# Altium schematic symbol library 13-Logic 数字 IC.SchLib: 324 symbols (part 12 of 30) (continued)
## TMS320C6424ZDU (continued)

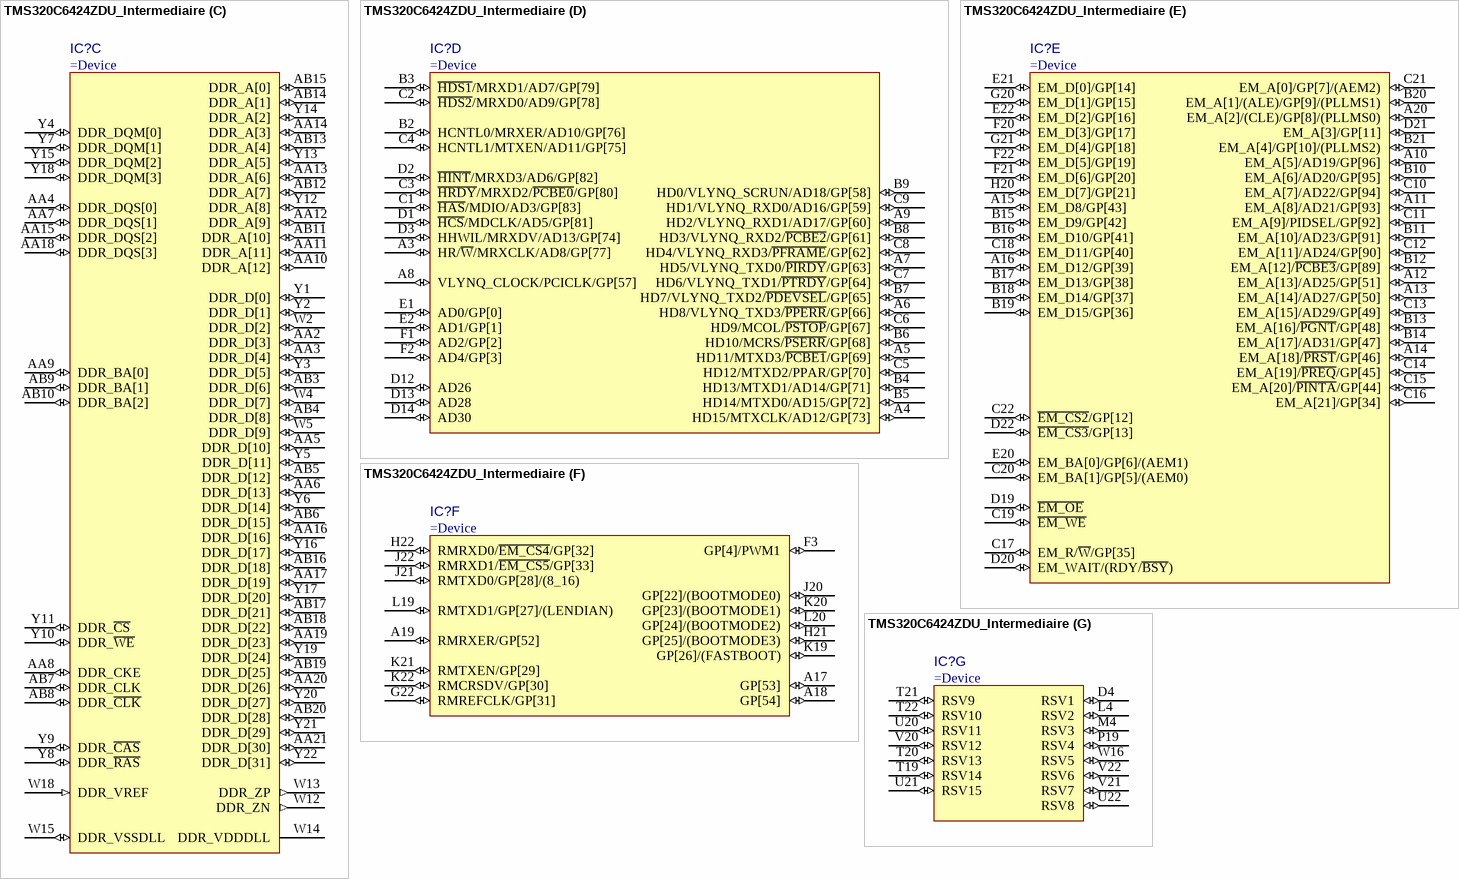
[diagram p75: symbol TMS320C6424ZDU_Intermediaire]

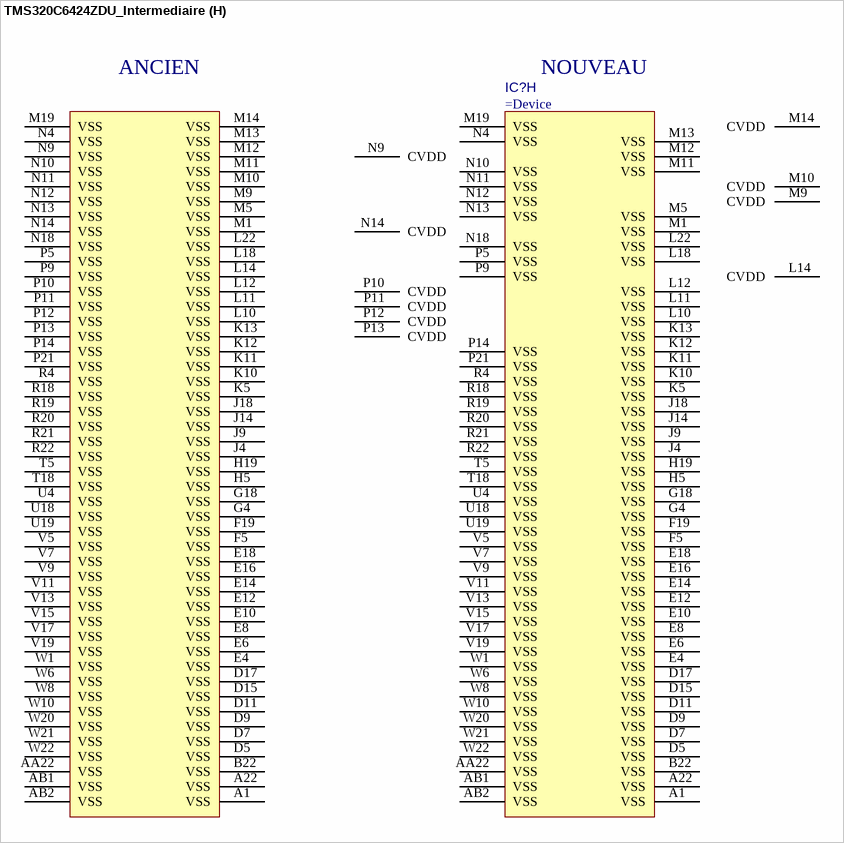
[diagram p76: symbol TMS320C6424ZDU_Intermediaire]

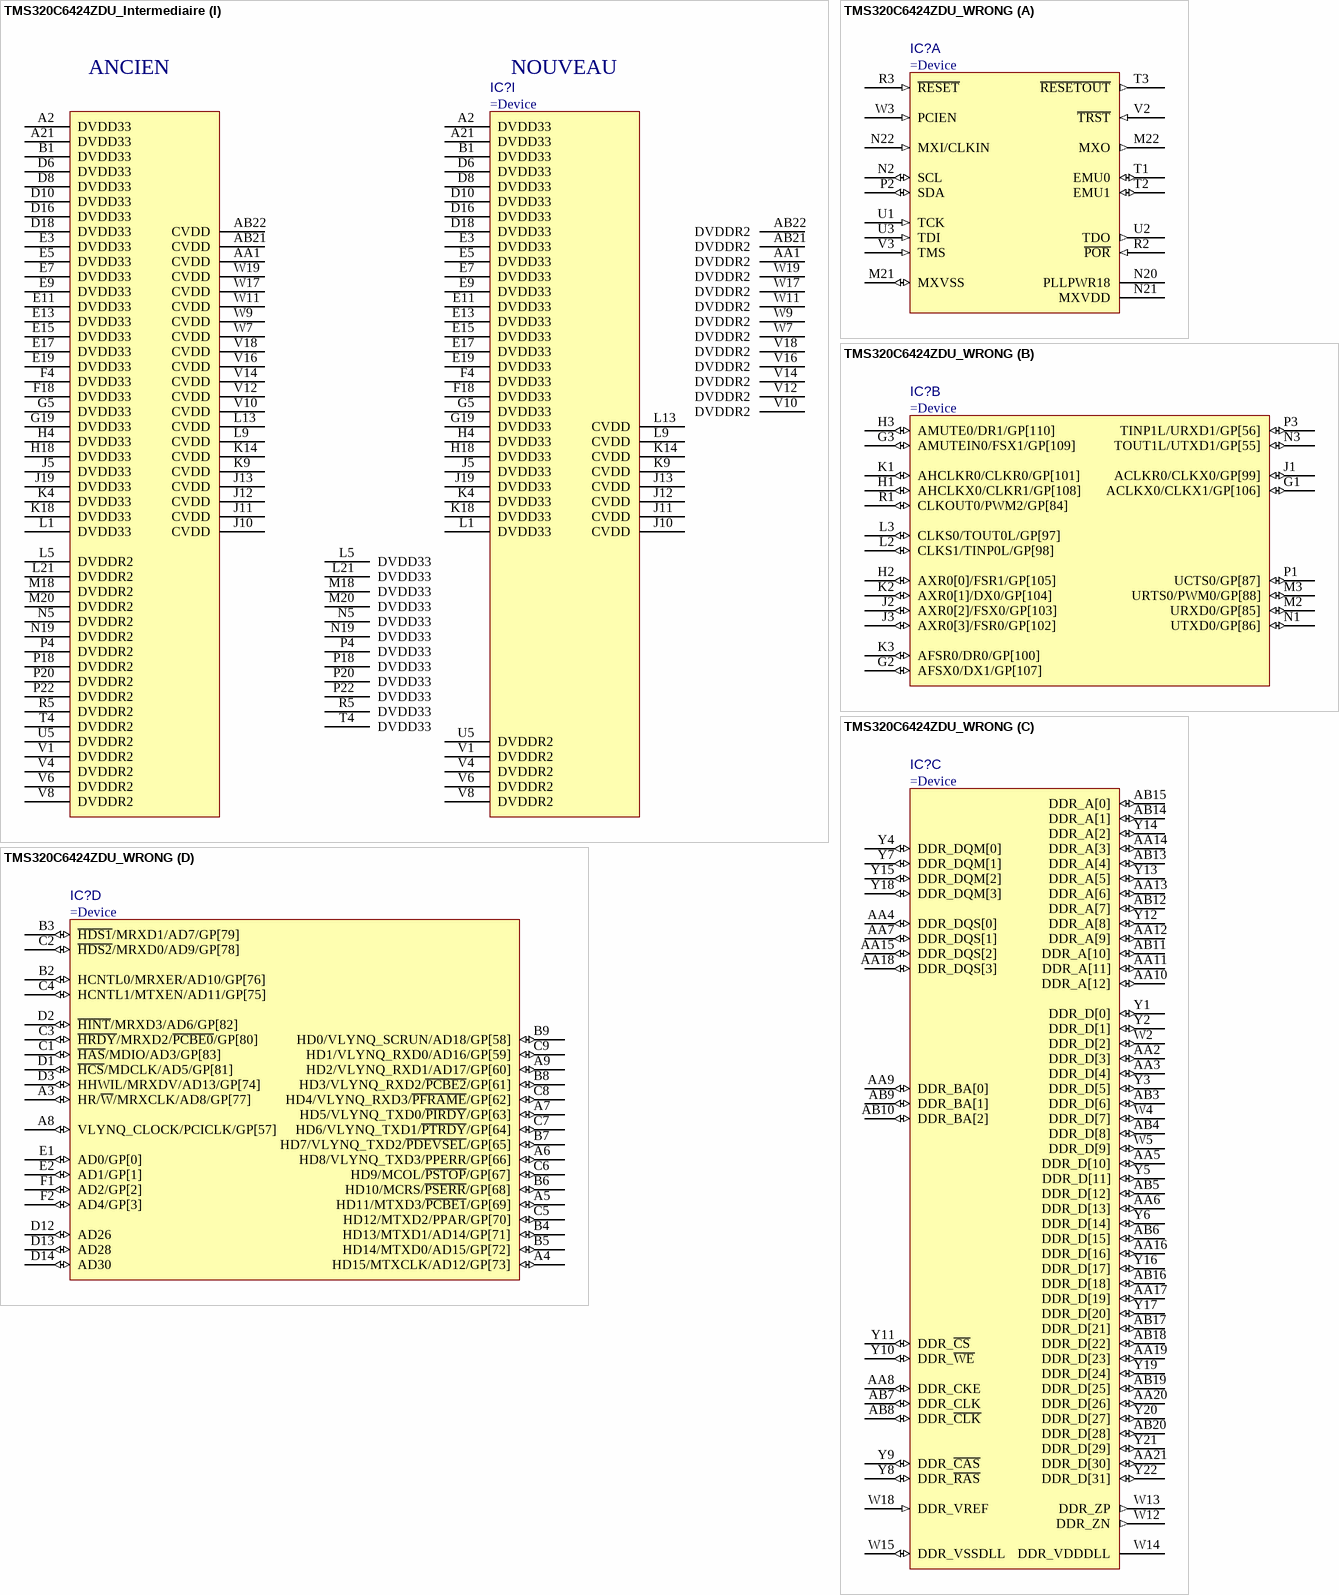
[diagram p77: symbols TMS320C6424ZDU_Intermediaire to TMS320C6424ZDU_WRONG]

## TMS320C6424ZDU_Intermediaire
designator IC?
Fixed-Point Digital Signal Processor (DSP)
part A pins: M21 MXVSS (io), M22 MXO (out), N2 SCL (io), N20 PLLPWR18 (power), N21 MXVDD (power), N22 MXI/CLKIN (in), P2 SDA (io), R2 ~{POR} (in), R3 ~{RESET} (in), T1 EMU0 (io), T2 EMU1 (io), T3 ~{RESETOUT} (out), U1 TCK (in), U2 TDO (out), U3 TDI (in), V2 ~{TRST} (in), V3 TMS (in), W3 PCIEN (in)
part B pins: G1 ACLKX0/CLKX1/GP[106] (io), G2 AFSX0/DX1/GP[107] (io), G3 AMUTEIN0/FSX1/GP[109] (io), H1 AHCLKX0/CLKR1/GP[108] (io), H2 AXR0[0]/FSR1/GP[105] (io), H3 AMUTE0/DR1/GP[110] (io), J1 ACLKR0/CLKX0/GP[99] (io), J2 AXR0[2]/FSX0/GP[103] (io), J3 AXR0[3]/FSR0/GP[102] (io), K1 AHCLKR0/CLKR0/GP[101] (io), K2 AXR0[1]/DX0/GP[104] (io), K3 AFSR0/DR0/GP[100] (io), L2 CLKS1/TINP0L/GP[98] (io), L3 CLKS0/TOUT0L/GP[97] (io), M2 URXD0/GP[85] (io), M3 URTS0/PWM0/GP[88] (io), N1 UTXD0/GP[86] (io), N3 TOUT1L/UTXD1/GP[55] (io), P1 UCTS0/GP[87] (io), P3 TINP1L/URXD1/GP[56] (io), R1 CLKOUT0/PWM2/GP[84] (io)
part C pins: AA2 DDR_D[3] (io), AA3 DDR_D[4] (io), AA4 DDR_DQS[0] (io), AA5 DDR_D[10] (io), AA6 DDR_D[13] (io), AA7 DDR_DQS[1] (io), AA8 DDR_CKE (io), AA9 DDR_BA[0] (io), AA10 DDR_A[12] (io), AA11 DDR_A[11] (io), AA12 DDR_A[9] (io), AA13 DDR_A[6] (io), AA14 DDR_A[3] (io), AA15 DDR_DQS[2] (io), AA16 DDR_D[16] (io), AA17 DDR_D[19] (io), AA18 DDR_DQS[3] (io), AA19 DDR_D[23] (io), AA20 DDR_D[26] (io), AA21 DDR_D[30] (io), AB3 DDR_D[6] (io), AB4 DDR_D[8] (io), AB5 DDR_D[12] (io), AB6 DDR_D[15] (io), AB7 DDR_CLK (io), AB8 DDR_~{CLK} (io), AB9 DDR_BA[1] (io), AB10 DDR_BA[2] (io), AB11 DDR_A[10] (io), AB12 DDR_A[7] (io), AB13 DDR_A[4] (io), AB14 DDR_A[1] (io), AB15 DDR_A[0] (io), AB16 DDR_D[18] (io), AB17 DDR_D[21] (io), AB18 DDR_D[22] (io), AB19 DDR_D[25] (io), AB20 DDR_D[28] (io), W2 DDR_D[2] (io), W4 DDR_D[7] (io), W5 DDR_D[9] (io), W12 DDR_ZN (out), W13 DDR_ZP (out), W14 DDR_VDDDLL (power), W15 DDR_VSSDLL (io), W18 DDR_VREF (in), Y1 DDR_D[0] (io), Y2 DDR_D[1] (io), Y3 DDR_D[5] (io), Y4 DDR_DQM[0] (io), Y5 DDR_D[11] (io), Y6 DDR_D[14] (io), Y7 DDR_DQM[1] (io), Y8 DDR_~{RAS} (io), Y9 DDR_~{CAS} (io), Y10 DDR_~{WE} (io), Y11 DDR_~{CS} (io), Y12 DDR_A[8] (io), Y13 DDR_A[5] (io), Y14 DDR_A[2] (io), Y15 DDR_DQM[2] (io), Y16 DDR_D[17] (io), Y17 DDR_D[20] (io), Y18 DDR_DQM[3] (io), Y19 DDR_D[24] (io), Y20 DDR_D[27] (io), Y21 DDR_D[29] (io), Y22 DDR_D[31] (io)
part D pins: A3 HR/~{W}/MRXCLK/AD8/GP[77] (io), A4 HD15/MTXCLK/AD12/GP[73] (io), A5 HD11/MTXD3/~{PCBE1}/GP[69] (io), A6 HD8/VLYNQ_TXD3/~{PPERR}/GP[66] (io), A7 HD5/VLYNQ_TXD0/~{PIRDY}/GP[63] (io), A8 VLYNQ_CLOCK/PCICLK/GP[57] (io), A9 HD2/VLYNQ_RXD1/AD17/GP[60] (io), B2 HCNTL0/MRXER/AD10/GP[76] (io), B3 ~{HDS1}/MRXD1/AD7/GP[79] (io), B4 HD13/MTXD1/AD14/GP[71] (io), B5 HD14/MTXD0/AD15/GP[72] (io), B6 HD10/MCRS/~{PSERR}/GP[68] (io), B7 HD7/VLYNQ_TXD2/~{PDEVSEL}/GP[65] (io), B8 HD3/VLYNQ_RXD2/~{PCBE2}/GP[61] (io), B9 HD0/VLYNQ_SCRUN/AD18/GP[58] (io), C1 ~{HAS}/MDIO/AD3/GP[83] (io), C2 ~{HDS2}/MRXD0/AD9/GP[78] (io), C3 ~{HRDY}/MRXD2/~{PCBE0}/GP[80] (io), C4 HCNTL1/MTXEN/AD11/GP[75] (io), C5 HD12/MTXD2/PPAR/GP[70] (io), C6 HD9/MCOL/~{PSTOP}/GP[67] (io), C7 HD6/VLYNQ_TXD1/~{PTRDY}/GP[64] (io), C8 HD4/VLYNQ_RXD3/~{PFRAME}/GP[62] (io), C9 HD1/VLYNQ_RXD0/AD16/GP[59] (io), D1 ~{HCS}/MDCLK/AD5/GP[81] (io), D2 ~{HINT}/MRXD3/AD6/GP[82] (io), D3 HHWIL/MRXDV/AD13/GP[74] (io), D12 AD26 (io), D13 AD28 (io), D14 AD30 (io), E1 AD0/GP[0] (io), E2 AD1/GP[1] (io), F1 AD2/GP[2] (io), F2 AD4/GP[3] (io)
part E pins: A10 EM_A[5]/AD19/GP[96] (io), A11 EM_A[8]/AD21/GP[93] (io), A12 EM_A[13]/AD25/GP[51] (io), A13 EM_A[14]/AD27/GP[50] (io), A14 EM_A[18]/~{PRST}/GP[46] (io), A15 EM_D8/GP[43] (io), A16 EM_D12/GP[39] (io), A20 EM_A[2]/(CLE)/GP[8]/(PLLMS0) (io), B10 EM_A[6]/AD20/GP[95] (io), B11 EM_A[10]/AD23/GP[91] (io), B12 EM_A[12]/~{PCBE3}/GP[89] (io), B13 EM_A[16]/~{PGNT}/GP[48] (io), B14 EM_A[17]/AD31/GP[47] (io), B15 EM_D9/GP[42] (io), B16 EM_D10/GP[41] (io), B17 EM_D13/GP[38] (io), B18 EM_D14/GP[37] (io), B19 EM_D15/GP[36] (io), B20 EM_A[1]/(ALE)/GP[9]/(PLLMS1) (io), B21 EM_A[4]/GP[10]/(PLLMS2) (io), C10 EM_A[7]/AD22/GP[94] (io), C11 EM_A[9]/PIDSEL/GP[92] (io), C12 EM_A[11]/AD24/GP[90] (io), C13 EM_A[15]/AD29/GP[49] (io), C14 EM_A[19]/~{PREQ}/GP[45] (io), C15 EM_A[20]/~{PINTA}/GP[44] (io), C16 EM_A[21]/GP[34] (io), C17 EM_R/~{W}/GP[35] (io), C18 EM_D11/GP[40] (io), C19 ~{EM_WE} (io), C20 EM_BA[1]/GP[5]/(AEM0) (io), C21 EM_A[0]/GP[7]/(AEM2) (io), C22 ~{EM_CS2}/GP[12] (io), D19 ~{EM_OE} (io), D20 EM_WAIT/(RDY/~{BSY}) (io), D21 EM_A[3]/GP[11] (io), D22 ~{EM_CS3}/GP[13] (io), E20 EM_BA[0]/GP[6]/(AEM1) (io), E21 EM_D[0]/GP[14] (io), E22 EM_D[2]/GP[16] (io), F20 EM_D[3]/GP[17] (io), F21 EM_D[6]/GP[20] (io), F22 EM_D[5]/GP[19] (io), G20 EM_D[1]/GP[15] (io), G21 EM_D[4]/GP[18] (io), H20 EM_D[7]/GP[21] (io)
part F pins: A17 GP[53] (io), A18 GP[54] (io), A19 RMRXER/GP[52] (io), F3 GP[4]/PWM1 (io), G22 RMREFCLK/GP[31] (io), H21 GP[25]/(BOOTMODE3) (io), H22 RMRXD0/~{EM_CS4}/GP[32] (io), J20 GP[22]/(BOOTMODE0) (io), J21 RMTXD0/GP[28]/(8_16) (io), J22 RMRXD1/~{EM_CS5}/GP[33] (io), K19 GP[26]/(FASTBOOT) (io), K20 GP[23]/(BOOTMODE1) (io), K21 RMTXEN/GP[29] (io), K22 RMCRSDV/GP[30] (io), L19 RMTXD1/GP[27]/(LENDIAN) (io), L20 GP[24]/(BOOTMODE2) (io)
part G pins: D4 RSV1 (io), L4 RSV2 (io), M4 RSV3 (io), P19 RSV4 (io), T19 RSV14 (io), T20 RSV13 (io), T21 RSV9 (io), T22 RSV10 (io), U20 RSV11 (io), U21 RSV15 (io), U22 RSV8 (io), V20 RSV12 (io), V21 RSV7 (io), V22 RSV6 (io), W16 RSV5 (io)
part H pins: A1 VSS (power), A1 VSS (power), A22 VSS (power), A22 VSS (power), AA22 VSS (power), AA22 VSS (power), AB1 VSS (power), AB1 VSS (power), AB2 VSS (power), AB2 VSS (power), B22 VSS (power), B22 VSS (power), D5 VSS (power), D5 VSS (power), D7 VSS (power), D7 VSS (power), D9 VSS (power), D9 VSS (power), D11 VSS (power), D11 VSS (power), D15 VSS (power), D15 VSS (power), D17 VSS (power), D17 VSS (power), E4 VSS (power), E4 VSS (power), E6 VSS (power), E6 VSS (power), E8 VSS (power), E8 VSS (power), E10 VSS (power), E10 VSS (power), E12 VSS (power), E12 VSS (power), E14 VSS (power), E14 VSS (power), E16 VSS (power), E16 VSS (power), E18 VSS (power), E18 VSS (power), F5 VSS (power), F5 VSS (power), F19 VSS (power), F19 VSS (power), G4 VSS (power), G4 VSS (power), G18 VSS (power), G18 VSS (power), H5 VSS (power), H5 VSS (power), H19 VSS (power), H19 VSS (power), J4 VSS (power), J4 VSS (power), J9 VSS (power), J9 VSS (power), J14 VSS (power), J14 VSS (power), J18 VSS (power), J18 VSS (power), K5 VSS (power), K5 VSS (power), K10 VSS (power), K10 VSS (power), K11 VSS (power), K11 VSS (power), K12 VSS (power), K12 VSS (power), K13 VSS (power), K13 VSS (power), L10 VSS (power), L10 VSS (power), L11 VSS (power), L11 VSS (power), L12 VSS (power), L12 VSS (power), L14 CVDD (power), L14 VSS (power), L18 VSS (power), L18 VSS (power), L22 VSS (power), L22 VSS (power), M1 VSS (power), M1 VSS (power), M5 VSS (power), M5 VSS (power), M9 CVDD (power), M9 VSS (power), M10 CVDD (power), M10 VSS (power), M11 VSS (power), M11 VSS (power), M12 VSS (power), M12 VSS (power), M13 VSS (power), M13 VSS (power), M14 CVDD (power), M14 VSS (power), M19 VSS (power), M19 VSS (power), N4 VSS (power), N4 VSS (power), N9 CVDD (power), N9 VSS (power), N10 VSS (power), N10 VSS (power), N11 VSS (power), N11 VSS (power), N12 VSS (power), N12 VSS (power), N13 VSS (power), N13 VSS (power), N14 CVDD (power), N14 VSS (power), N18 VSS (power), N18 VSS (power), P5 VSS (power), P5 VSS (power), P9 VSS (power), P9 VSS (power), P10 CVDD (power), P10 VSS (power), P11 CVDD (power), P11 VSS (power), P12 CVDD (power), P12 VSS (power), P13 CVDD (power), P13 VSS (power), P14 VSS (power), P14 VSS (power), P21 VSS (power), P21 VSS (power), R4 VSS (power), R4 VSS (power), R18 VSS (power), R18 VSS (power), R19 VSS (power), R19 VSS (power), R20 VSS (power), R20 VSS (power), R21 VSS (power), R21 VSS (power), R22 VSS (power), R22 VSS (power), T5 VSS (power), T5 VSS (power), T18 VSS (power), T18 VSS (power), U4 VSS (power), U4 VSS (power), U18 VSS (power), U18 VSS (power), U19 VSS (power), U19 VSS (power), V5 VSS (power), V5 VSS (power), V7 VSS (power), V7 VSS (power), V9 VSS (power), V9 VSS (power), V11 VSS (power), V11 VSS (power), V13 VSS (power), V13 VSS (power), V15 VSS (power), V15 VSS (power), V17 VSS (power), V17 VSS (power), V19 VSS (power), V19 VSS (power), W1 VSS (power), W1 VSS (power), W6 VSS (power), W6 VSS (power), W8 VSS (power), W8 VSS (power), W10 VSS (power), W10 VSS (power), W20 VSS (power), W20 VSS (power), W21 VSS (power), W21 VSS (power), W22 VSS (power), W22 VSS (power)
part I pins: A2 DVDD33 (power), A2 DVDD33 (power), A21 DVDD33 (power), A21 DVDD33 (power), AA1 DVDDR2 (power), AA1 CVDD (power), AB21 DVDDR2 (power), AB21 CVDD (power), AB22 DVDDR2 (power), AB22 CVDD (power), B1 DVDD33 (power), B1 DVDD33 (power), D6 DVDD33 (power), D6 DVDD33 (power), D8 DVDD33 (power), D8 DVDD33 (power), D10 DVDD33 (power), D10 DVDD33 (power), D16 DVDD33 (power), D16 DVDD33 (power), D18 DVDD33 (power), D18 DVDD33 (power), E3 DVDD33 (power), E3 DVDD33 (power), E5 DVDD33 (power), E5 DVDD33 (power), E7 DVDD33 (power), E7 DVDD33 (power), E9 DVDD33 (power), E9 DVDD33 (power), E11 DVDD33 (power), E11 DVDD33 (power), E13 DVDD33 (power), E13 DVDD33 (power), E15 DVDD33 (power), E15 DVDD33 (power), E17 DVDD33 (power), E17 DVDD33 (power), E19 DVDD33 (power), E19 DVDD33 (power), F4 DVDD33 (power), F4 DVDD33 (power), F18 DVDD33 (power), F18 DVDD33 (power), G5 DVDD33 (power), G5 DVDD33 (power), G19 DVDD33 (power), G19 DVDD33 (power), H4 DVDD33 (power), H4 DVDD33 (power), H18 DVDD33 (power), H18 DVDD33 (power), J5 DVDD33 (power), J5 DVDD33 (power), J10 CVDD (power), J10 CVDD (power), J11 CVDD (power), J11 CVDD (power), J12 CVDD (power), J12 CVDD (power), J13 CVDD (power), J13 CVDD (power), J19 DVDD33 (power), J19 DVDD33 (power), K4 DVDD33 (power), K4 DVDD33 (power), K9 CVDD (power), K9 CVDD (power), K14 CVDD (power), K14 CVDD (power), K18 DVDD33 (power), K18 DVDD33 (power), L1 DVDD33 (power), L1 DVDD33 (power), L5 DVDD33 (power), L5 DVDDR2 (power), L9 CVDD (power), L9 CVDD (power), L13 CVDD (power), L13 CVDD (power), L21 DVDD33 (power), L21 DVDDR2 (power), M18 DVDD33 (power), M18 DVDDR2 (power), M20 DVDD33 (power), M20 DVDDR2 (power), N5 DVDD33 (power), N5 DVDDR2 (power), N19 DVDD33 (power), N19 DVDDR2 (power), P4 DVDD33 (power), P4 DVDDR2 (power), P18 DVDD33 (power), P18 DVDDR2 (power), P20 DVDD33 (power), P20 DVDDR2 (power), P22 DVDD33 (power), P22 DVDDR2 (power), R5 DVDD33 (power), R5 DVDDR2 (power), T4 DVDD33 (power), T4 DVDDR2 (power), U5 DVDDR2 (power), U5 DVDDR2 (power), V1 DVDDR2 (power), V1 DVDDR2 (power), V4 DVDDR2 (power), V4 DVDDR2 (power), V6 DVDDR2 (power), V6 DVDDR2 (power), V8 DVDDR2 (power), V8 DVDDR2 (power), V10 DVDDR2 (power), V10 CVDD (power), V12 DVDDR2 (power), V12 CVDD (power), V14 DVDDR2 (power), V14 CVDD (power), V16 DVDDR2 (power), V16 CVDD (power), V18 DVDDR2 (power), V18 CVDD (power), W7 DVDDR2 (power), W7 CVDD (power), W9 DVDDR2 (power), W9 CVDD (power), W11 DVDDR2 (power), W11 CVDD (power), W17 DVDDR2 (power), W17 CVDD (power), W19 DVDDR2 (power), W19 CVDD (power)
part H text: ANCIEN; NOUVEAU
part I text: ANCIEN; NOUVEAU

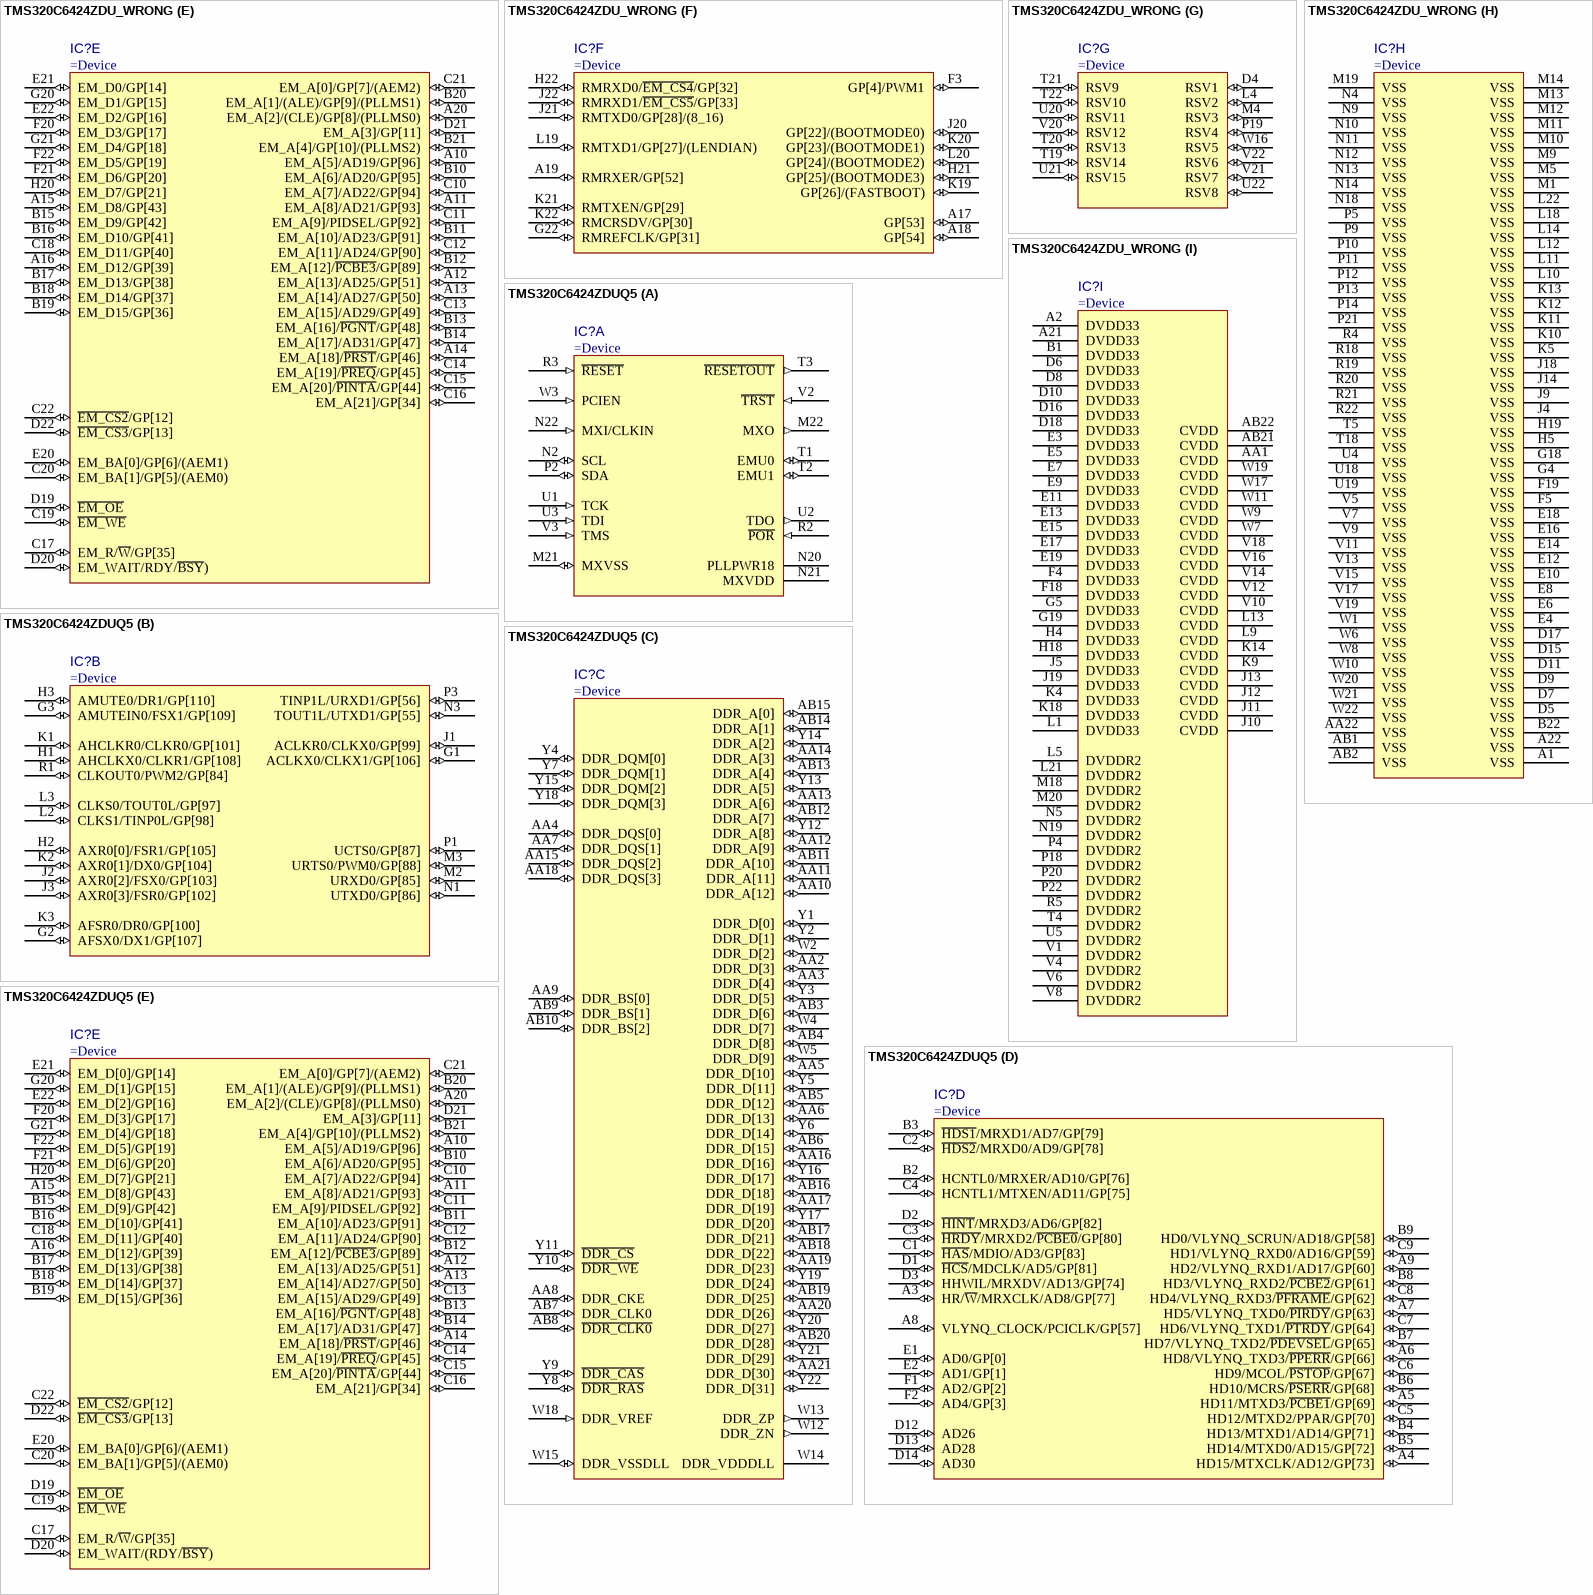
[diagram p78: symbols TMS320C6424ZDU_WRONG to TMS320C6424ZDUQ5]

## TMS320C6424ZDU_WRONG
designator IC?
Fixed-Point Digital Signal Processor (DSP)
part A pins: M21 MXVSS (io), M22 MXO (out), N2 SCL (io), N20 PLLPWR18 (power), N21 MXVDD (power), N22 MXI/CLKIN (in), P2 SDA (io), R2 ~{POR} (in), R3 ~{RESET} (in), T1 EMU0 (io), T2 EMU1 (io), T3 ~{RESETOUT} (out), U1 TCK (in), U2 TDO (out), U3 TDI (in), V2 ~{TRST} (in), V3 TMS (in), W3 PCIEN (in)
part B pins: G1 ACLKX0/CLKX1/GP[106] (io), G2 AFSX0/DX1/GP[107] (io), G3 AMUTEIN0/FSX1/GP[109] (io), H1 AHCLKX0/CLKR1/GP[108] (io), H2 AXR0[0]/FSR1/GP[105] (io), H3 AMUTE0/DR1/GP[110] (io), J1 ACLKR0/CLKX0/GP[99] (io), J2 AXR0[2]/FSX0/GP[103] (io), J3 AXR0[3]/FSR0/GP[102] (io), K1 AHCLKR0/CLKR0/GP[101] (io), K2 AXR0[1]/DX0/GP[104] (io), K3 AFSR0/DR0/GP[100] (io), L2 CLKS1/TINP0L/GP[98] (io), L3 CLKS0/TOUT0L/GP[97] (io), M2 URXD0/GP[85] (io), M3 URTS0/PWM0/GP[88] (io), N1 UTXD0/GP[86] (io), N3 TOUT1L/UTXD1/GP[55] (io), P1 UCTS0/GP[87] (io), P3 TINP1L/URXD1/GP[56] (io), R1 CLKOUT0/PWM2/GP[84] (io)
part C pins: AA2 DDR_D[3] (io), AA3 DDR_D[4] (io), AA4 DDR_DQS[0] (io), AA5 DDR_D[10] (io), AA6 DDR_D[13] (io), AA7 DDR_DQS[1] (io), AA8 DDR_CKE (io), AA9 DDR_BA[0] (io), AA10 DDR_A[12] (io), AA11 DDR_A[11] (io), AA12 DDR_A[9] (io), AA13 DDR_A[6] (io), AA14 DDR_A[3] (io), AA15 DDR_DQS[2] (io), AA16 DDR_D[16] (io), AA17 DDR_D[19] (io), AA18 DDR_DQS[3] (io), AA19 DDR_D[23] (io), AA20 DDR_D[26] (io), AA21 DDR_D[30] (io), AB3 DDR_D[6] (io), AB4 DDR_D[8] (io), AB5 DDR_D[12] (io), AB6 DDR_D[15] (io), AB7 DDR_CLK (io), AB8 DDR_~{CLK} (io), AB9 DDR_BA[1] (io), AB10 DDR_BA[2] (io), AB11 DDR_A[10] (io), AB12 DDR_A[7] (io), AB13 DDR_A[4] (io), AB14 DDR_A[1] (io), AB15 DDR_A[0] (io), AB16 DDR_D[18] (io), AB17 DDR_D[21] (io), AB18 DDR_D[22] (io), AB19 DDR_D[25] (io), AB20 DDR_D[28] (io), W2 DDR_D[2] (io), W4 DDR_D[7] (io), W5 DDR_D[9] (io), W12 DDR_ZN (out), W13 DDR_ZP (out), W14 DDR_VDDDLL (power), W15 DDR_VSSDLL (io), W18 DDR_VREF (in), Y1 DDR_D[0] (io), Y2 DDR_D[1] (io), Y3 DDR_D[5] (io), Y4 DDR_DQM[0] (io), Y5 DDR_D[11] (io), Y6 DDR_D[14] (io), Y7 DDR_DQM[1] (io), Y8 DDR_~{RAS} (io), Y9 DDR_~{CAS} (io), Y10 DDR_~{WE} (io), Y11 DDR_~{CS} (io), Y12 DDR_A[8] (io), Y13 DDR_A[5] (io), Y14 DDR_A[2] (io), Y15 DDR_DQM[2] (io), Y16 DDR_D[17] (io), Y17 DDR_D[20] (io), Y18 DDR_DQM[3] (io), Y19 DDR_D[24] (io), Y20 DDR_D[27] (io), Y21 DDR_D[29] (io), Y22 DDR_D[31] (io)
part D pins: A3 HR/~{W}/MRXCLK/AD8/GP[77] (io), A4 HD15/MTXCLK/AD12/GP[73] (io), A5 HD11/MTXD3/~{PCBE1}/GP[69] (io), A6 HD8/VLYNQ_TXD3/PPERR/GP[66] (io), A7 HD5/VLYNQ_TXD0/~{PIRDY}/GP[63] (io), A8 VLYNQ_CLOCK/PCICLK/GP[57] (io), A9 HD2/VLYNQ_RXD1/AD17/GP[60] (io), B2 HCNTL0/MRXER/AD10/GP[76] (io), B3 ~{HDS1}/MRXD1/AD7/GP[79] (io), B4 HD13/MTXD1/AD14/GP[71] (io), B5 HD14/MTXD0/AD15/GP[72] (io), B6 HD10/MCRS/~{PSERR}/GP[68] (io), B7 HD7/VLYNQ_TXD2/~{PDEVSEL}/GP[65] (io), B8 HD3/VLYNQ_RXD2/~{PCBE2}/GP[61] (io), B9 HD0/VLYNQ_SCRUN/AD18/GP[58] (io), C1 ~{HAS}/MDIO/AD3/GP[83] (io), C2 ~{HDS2}/MRXD0/AD9/GP[78] (io), C3 ~{HRDY}/MRXD2/~{PCBE0}/GP[80] (io), C4 HCNTL1/MTXEN/AD11/GP[75] (io), C5 HD12/MTXD2/PPAR/GP[70] (io), C6 HD9/MCOL/~{PSTOP}/GP[67] (io), C7 HD6/VLYNQ_TXD1/~{PTRDY}/GP[64] (io), C8 HD4/VLYNQ_RXD3/~{PFRAME}/GP[62] (io), C9 HD1/VLYNQ_RXD0/AD16/GP[59] (io), D1 ~{HCS}/MDCLK/AD5/GP[81] (io), D2 ~{HINT}/MRXD3/AD6/GP[82] (io), D3 HHWIL/MRXDV/AD13/GP[74] (io), D12 AD26 (io), D13 AD28 (io), D14 AD30 (io), E1 AD0/GP[0] (io), E2 AD1/GP[1] (io), F1 AD2/GP[2] (io), F2 AD4/GP[3] (io)
part E pins: A10 EM_A[5]/AD19/GP[96] (io), A11 EM_A[8]/AD21/GP[93] (io), A12 EM_A[13]/AD25/GP[51] (io), A13 EM_A[14]/AD27/GP[50] (io), A14 EM_A[18]/~{PRST}/GP[46] (io), A15 EM_D8/GP[43] (io), A16 EM_D12/GP[39] (io), A20 EM_A[2]/(CLE)/GP[8]/(PLLMS0) (io), B10 EM_A[6]/AD20/GP[95] (io), B11 EM_A[10]/AD23/GP[91] (io), B12 EM_A[12]/~{PCBE3}/GP[89] (io), B13 EM_A[16]/~{PGNT}/GP[48] (io), B14 EM_A[17]/AD31/GP[47] (io), B15 EM_D9/GP[42] (io), B16 EM_D10/GP[41] (io), B17 EM_D13/GP[38] (io), B18 EM_D14/GP[37] (io), B19 EM_D15/GP[36] (io), B20 EM_A[1]/(ALE)/GP[9]/(PLLMS1) (io), B21 EM_A[4]/GP[10]/(PLLMS2) (io), C10 EM_A[7]/AD22/GP[94] (io), C11 EM_A[9]/PIDSEL/GP[92] (io), C12 EM_A[11]/AD24/GP[90] (io), C13 EM_A[15]/AD29/GP[49] (io), C14 EM_A[19]/~{PREQ}/GP[45] (io), C15 EM_A[20]/~{PINTA}/GP[44] (io), C16 EM_A[21]/GP[34] (io), C17 EM_R/~{W}/GP[35] (io), C18 EM_D11/GP[40] (io), C19 ~{EM_WE} (io), C20 EM_BA[1]/GP[5]/(AEM0) (io), C21 EM_A[0]/GP[7]/(AEM2) (io), C22 ~{EM_CS2}/GP[12] (io), D19 ~{EM_OE} (io), D20 EM_WAIT/RDY/~{BSY}) (io), D21 EM_A[3]/GP[11] (io), D22 ~{EM_CS3}/GP[13] (io), E20 EM_BA[0]/GP[6]/(AEM1) (io), E21 EM_D0/GP[14] (io), E22 EM_D2/GP[16] (io), F20 EM_D3/GP[17] (io), F21 EM_D6/GP[20] (io), F22 EM_D5/GP[19] (io), G20 EM_D1/GP[15] (io), G21 EM_D4/GP[18] (io), H20 EM_D7/GP[21] (io)
part F pins: A17 GP[53] (io), A18 GP[54] (io), A19 RMRXER/GP[52] (io), F3 GP[4]/PWM1 (io), G22 RMREFCLK/GP[31] (io), H21 GP[25]/(BOOTMODE3) (io), H22 RMRXD0/~{EM_CS4}/GP[32] (io), J20 GP[22]/(BOOTMODE0) (io), J21 RMTXD0/GP[28]/(8_16) (io), J22 RMRXD1/~{EM_CS5}/GP[33] (io), K19 GP[26]/(FASTBOOT) (io), K20 GP[23]/(BOOTMODE1) (io), K21 RMTXEN/GP[29] (io), K22 RMCRSDV/GP[30] (io), L19 RMTXD1/GP[27]/(LENDIAN) (io), L20 GP[24]/(BOOTMODE2) (io)
part G pins: D4 RSV1 (io), L4 RSV2 (io), M4 RSV3 (io), P19 RSV4 (io), T19 RSV14 (io), T20 RSV13 (io), T21 RSV9 (io), T22 RSV10 (io), U20 RSV11 (io), U21 RSV15 (io), U22 RSV8 (io), V20 RSV12 (io), V21 RSV7 (io), V22 RSV6 (io), W16 RSV5 (io)
part H pins: A1 VSS (power), A22 VSS (power), AA22 VSS (power), AB1 VSS (power), AB2 VSS (power), B22 VSS (power), D5 VSS (power), D7 VSS (power), D9 VSS (power), D11 VSS (power), D15 VSS (power), D17 VSS (power), E4 VSS (power), E6 VSS (power), E8 VSS (power), E10 VSS (power), E12 VSS (power), E14 VSS (power), E16 VSS (power), E18 VSS (power), F5 VSS (power), F19 VSS (power), G4 VSS (power), G18 VSS (power), H5 VSS (power), H19 VSS (power), J4 VSS (power), J9 VSS (power), J14 VSS (power), J18 VSS (power), K5 VSS (power), K10 VSS (power), K11 VSS (power), K12 VSS (power), K13 VSS (power), L10 VSS (power), L11 VSS (power), L12 VSS (power), L14 VSS (power), L18 VSS (power), L22 VSS (power), M1 VSS (power), M5 VSS (power), M9 VSS (power), M10 VSS (power), M11 VSS (power), M12 VSS (power), M13 VSS (power), M14 VSS (power), M19 VSS (power), N4 VSS (power), N9 VSS (power), N10 VSS (power), N11 VSS (power), N12 VSS (power), N13 VSS (power), N14 VSS (power), N18 VSS (power), P5 VSS (power), P9 VSS (power), P10 VSS (power), P11 VSS (power), P12 VSS (power), P13 VSS (power), P14 VSS (power), P21 VSS (power), R4 VSS (power), R18 VSS (power), R19 VSS (power), R20 VSS (power), R21 VSS (power), R22 VSS (power), T5 VSS (power), T18 VSS (power), U4 VSS (power), U18 VSS (power), U19 VSS (power), V5 VSS (power), V7 VSS (power), V9 VSS (power), V11 VSS (power), V13 VSS (power), V15 VSS (power), V17 VSS (power), V19 VSS (power), W1 VSS (power), W6 VSS (power), W8 VSS (power), W10 VSS (power), W20 VSS (power), W21 VSS (power), W22 VSS (power)
part I pins: A2 DVDD33 (power), A21 DVDD33 (power), AA1 CVDD (power), AB21 CVDD (power), AB22 CVDD (power), B1 DVDD33 (power), D6 DVDD33 (power), D8 DVDD33 (power), D10 DVDD33 (power), D16 DVDD33 (power), D18 DVDD33 (power), E3 DVDD33 (power), E5 DVDD33 (power), E7 DVDD33 (power), E9 DVDD33 (power), E11 DVDD33 (power), E13 DVDD33 (power), E15 DVDD33 (power), E17 DVDD33 (power), E19 DVDD33 (power), F4 DVDD33 (power), F18 DVDD33 (power), G5 DVDD33 (power), G19 DVDD33 (power), H4 DVDD33 (power), H18 DVDD33 (power), J5 DVDD33 (power), J10 CVDD (power), J11 CVDD (power), J12 CVDD (power), J13 CVDD (power), J19 DVDD33 (power), K4 DVDD33 (power), K9 CVDD (power), K14 CVDD (power), K18 DVDD33 (power), L1 DVDD33 (power), L5 DVDDR2 (power), L9 CVDD (power), L13 CVDD (power), L21 DVDDR2 (power), M18 DVDDR2 (power), M20 DVDDR2 (power), N5 DVDDR2 (power), N19 DVDDR2 (power), P4 DVDDR2 (power), P18 DVDDR2 (power), P20 DVDDR2 (power), P22 DVDDR2 (power), R5 DVDDR2 (power), T4 DVDDR2 (power), U5 DVDDR2 (power), V1 DVDDR2 (power), V4 DVDDR2 (power), V6 DVDDR2 (power), V8 DVDDR2 (power), V10 CVDD (power), V12 CVDD (power), V14 CVDD (power), V16 CVDD (power), V18 CVDD (power), W7 CVDD (power), W9 CVDD (power), W11 CVDD (power), W17 CVDD (power), W19 CVDD (power)

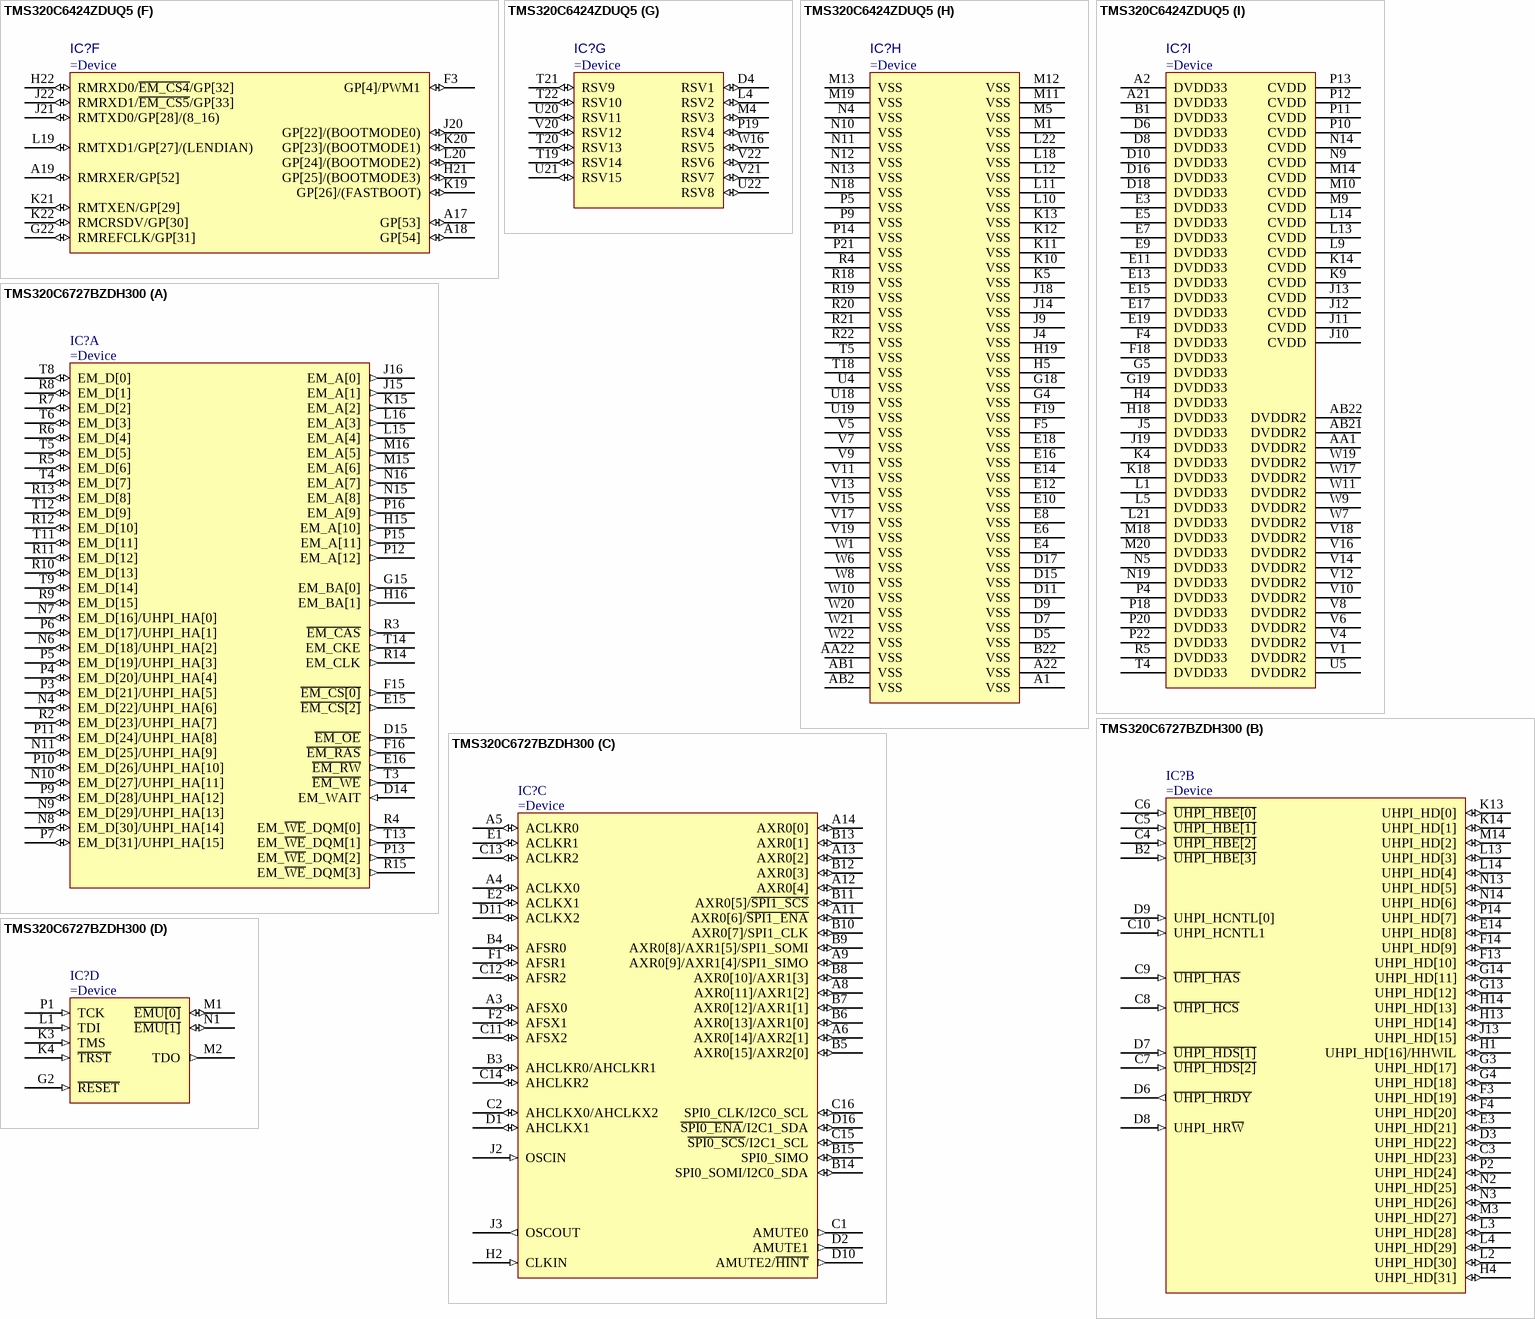
[diagram p79: symbols TMS320C6424ZDUQ5 to TMS320C6727BZDH300]